# Altium footprint library Miscellaneous C_nn.PcbLib: 416 footprints (part 5 of 26)
Each footprint in its own frame and in the unit in brackets; x right, y up, seen from the top. Pads: shape width x height; smd on the part's side, far side on the other; paste and mask are expansions set on the pad; w line width, h text height; cw(c..) or ccw(c..) is an arc to the next point about the centre after c.
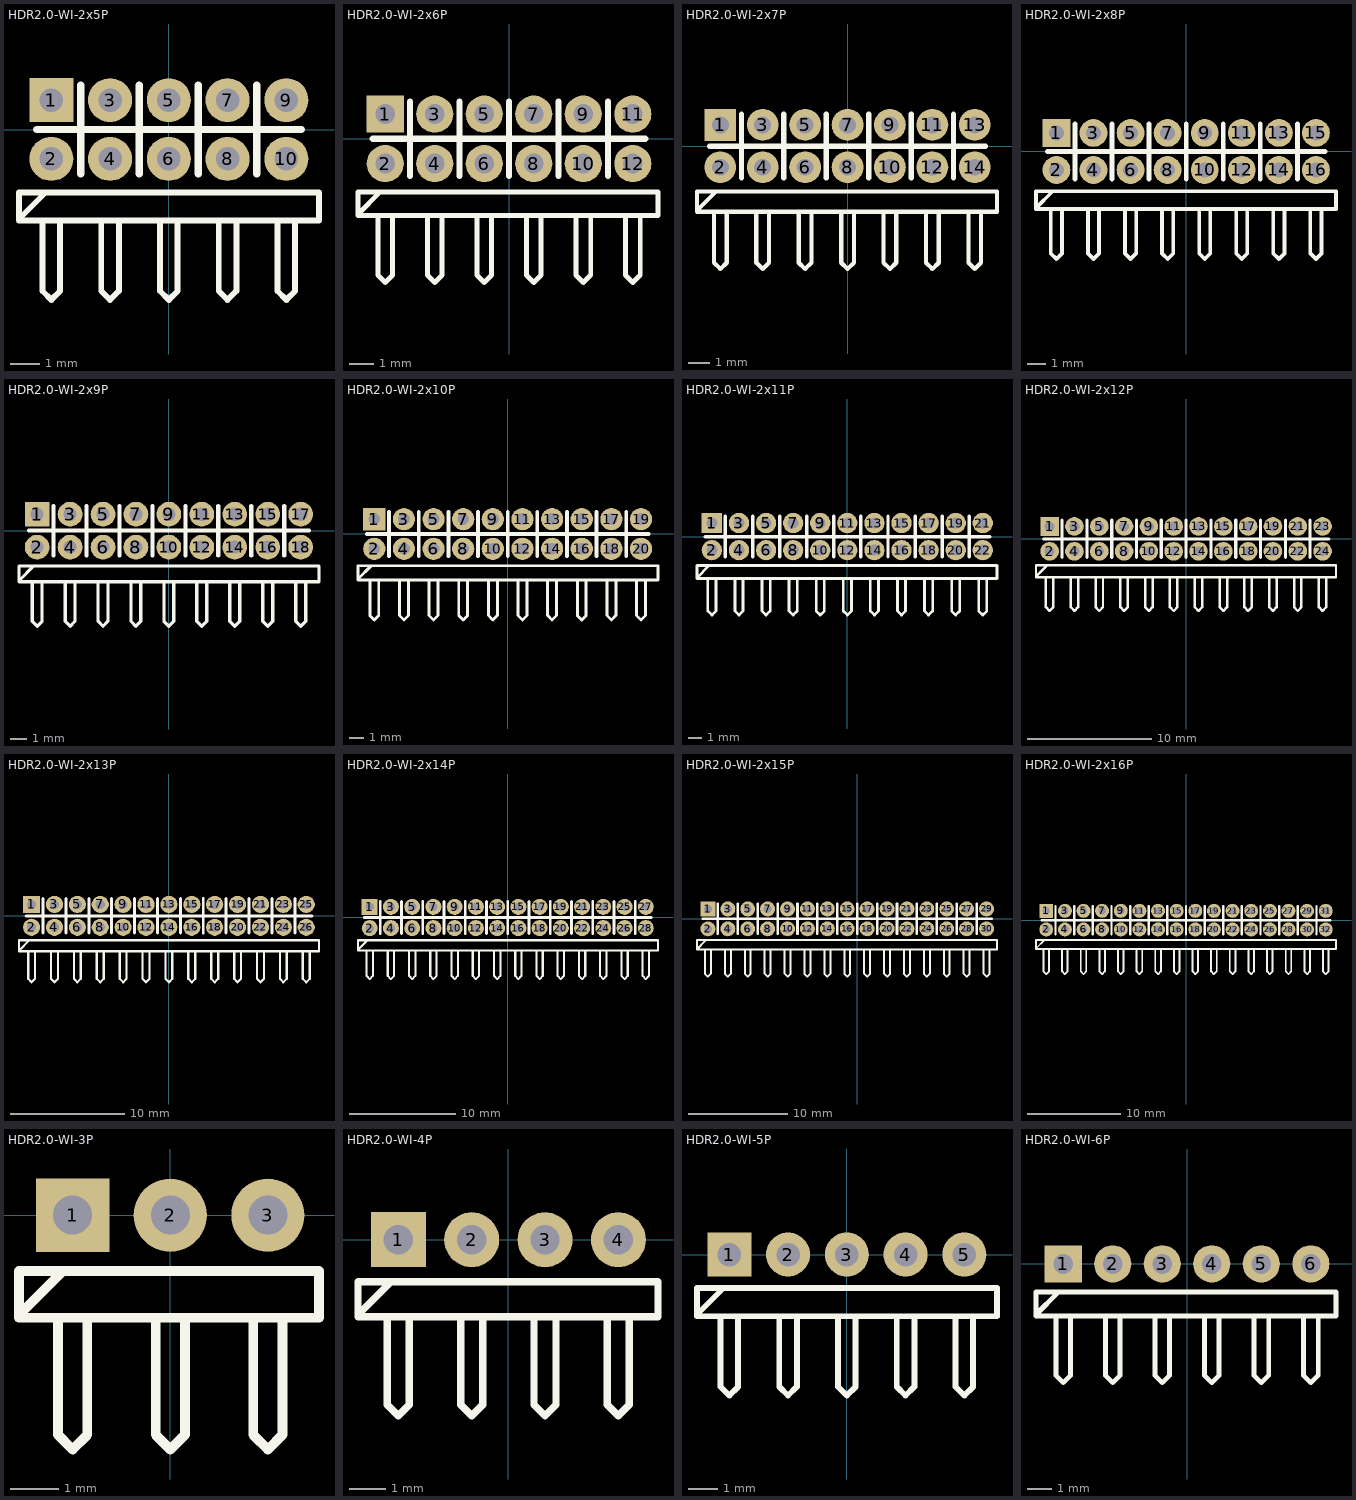
[diagram p4: the footprints below, top view; thin cyan lines are the x and y axes]

## HDR2.0-WI-2x5P [mm] "卧插，脚距：2.0mm"
pads (10):
  rect 1.5x1.5 hole 0.8: 1(-4,1)
  round 1.5 hole 0.8: 2(-4,-1) 3(-2,1) 4(-2,-1) 5(0,1) 6(0,-1) 7(2,1) 8(2,-1) 9(4,1) 10(4,-1)
Top Overlay:
  lines w0.2: -5.1,-2.8 -5.1,-2.743 ; -4.3,-3.2 -4.3,-5.5 -4,-5.8 -3.7,-5.5 -3.7,-3.1 ; -4.2,-2.143 -5.1,-3.043 -5.1,-3.1 ; -2.3,-3.2 -2.3,-5.5 -2,-5.8 -1.7,-5.5 -1.7,-3.1 ; -0.3,-3.2 -0.3,-5.5 0,-5.8 0.3,-5.5 0.3,-3.1 ; 1.7,-3.2 1.7,-5.5 2,-5.8 2.3,-5.5 2.3,-3.1 ; 3.7,-3.2 3.7,-5.5 4,-5.8 4.3,-5.5 4.3,-3.1 ; -5.1,-3.1 -5.1,-2.143 -3.492,-2.143 5.112,-2.143 5.112,-3.1 -5.1,-3.1
  lines w0.254: -4.5,0 4.5,0 ; -3,-1.5 -3,1.5 ; -1,-1.5 -1,1.5 ; 1,-1.5 1,1.5 ; 3,-1.5 3,1.5
Bottom Overlay:
  lines w0.254: -4.5,0 4.5,0 ; -3,-1.5 -3,1.5 ; -1,-1.5 -1,1.5 ; 1,-1.5 1,1.5 ; 3,-1.5 3,1.5
3D body "HDR2.0-WI-2x5P.STEP": height 5.25, standoff -2.77, extent -5,-6 5,2

## HDR2.0-WI-2x6P [mm] "卧插，脚距：2.0mm"
pads (12):
  rect 1.5x1.5 hole 0.8: 1(-5,1)
  round 1.5 hole 0.8: 2(-5,-1) 3(-3,1) 4(-3,-1) 5(-1,1) 6(-1,-1) 7(1,1) 8(1,-1) 9(3,1) 10(3,-1) 11(5,1) 12(5,-1)
Top Overlay:
  lines w0.2: -6.1,-2.8 -6.1,-2.743 ; -5.3,-3.2 -5.3,-5.5 -5,-5.8 -4.7,-5.5 -4.7,-3.1 ; -5.2,-2.143 -6.1,-3.043 -6.1,-3.1 ; -3.3,-3.2 -3.3,-5.5 -3,-5.8 -2.7,-5.5 -2.7,-3.1 ; -1.3,-3.2 -1.3,-5.5 -1,-5.8 -0.7,-5.5 -0.7,-3.1 ; 0.7,-3.2 0.7,-5.5 1,-5.8 1.3,-5.5 1.3,-3.1 ; 2.7,-3.2 2.7,-5.5 3,-5.8 3.3,-5.5 3.3,-3.1 ; 4.7,-3.2 4.7,-5.5 5,-5.8 5.3,-5.5 5.3,-3.1 ; -6.1,-3.1 6.017,-3.1 6.017,-2.143 -4.492,-2.143 -6.1,-2.143 -6.1,-3.1
  lines w0.254: -5.5,0 5.5,0 ; -4,-1.5 -4,1.5 ; -2,-1.5 -2,1.5 ; 0,-1.5 0,1.5 ; 2,-1.5 2,1.5 ; 4,-1.5 4,1.5
Bottom Overlay:
  lines w0.254: -5.5,0 5.5,0 ; -4,-1.5 -4,1.5 ; -2,-1.5 -2,1.5 ; 0,-1.5 0,1.5 ; 2,-1.5 2,1.5 ; 4,-1.5 4,1.5
3D body "HDR2.0-WI-2x6P.STEP": height 5.25, standoff -2.77, extent -6,-6 6,2

## HDR2.0-WI-2x7P [mm] "卧插，脚距：2.0mm"
pads (14):
  rect 1.5x1.5 hole 0.8: 1(-6,1)
  round 1.5 hole 0.8: 2(-6,-1) 3(-4,1) 4(-4,-1) 5(-2,1) 6(-2,-1) 7(0,1) 8(0,-1) 9(2,1) 10(2,-1) 11(4,1) 12(4,-1) 13(6,1) 14(6,-1)
Top Overlay:
  lines w0.2: -7.1,-2.8 -7.1,-2.743 ; -6.3,-3.2 -6.3,-5.5 -6,-5.8 -5.7,-5.5 -5.7,-3.1 ; -6.2,-2.143 -7.1,-3.043 -7.1,-3.1 ; -4.3,-3.2 -4.3,-5.5 -4,-5.8 -3.7,-5.5 -3.7,-3.1 ; -2.3,-3.2 -2.3,-5.5 -2,-5.8 -1.7,-5.5 -1.7,-3.1 ; -0.3,-3.2 -0.3,-5.5 0,-5.8 0.3,-5.5 0.3,-3.1 ; 1.7,-3.2 1.7,-5.5 2,-5.8 2.3,-5.5 2.3,-3.1 ; 3.7,-3.2 3.7,-5.5 4,-5.8 4.3,-5.5 4.3,-3.1 ; 5.7,-3.2 5.7,-5.5 6,-5.8 6.3,-5.5 6.3,-3.1 ; -7.1,-3.1 -7.1,-2.143 -5.492,-2.143 7.049,-2.143 7.049,-3.1 -7.1,-3.1
  lines w0.254: -6.5,0 6.5,0 ; -5,-1.5 -5,1.5 ; -3,-1.5 -3,1.5 ; -1,-1.5 -1,1.5 ; 1,-1.5 1,1.5 ; 3,-1.5 3,1.5 ; 5,-1.5 5,1.5
Bottom Overlay:
  lines w0.254: -6.5,0 6.5,0 ; -5,-1.5 -5,1.5 ; -3,-1.5 -3,1.5 ; -1,-1.5 -1,1.5 ; 1,-1.5 1,1.5 ; 3,-1.5 3,1.5 ; 5,-1.5 5,1.5
3D body "HDR2.0-WI-2x7P.STEP": height 5.25, standoff -2.77, extent -7,-6 7,2

## HDR2.0-WI-2x8P [mm] "卧插，脚距：2.0mm"
pads (16):
  rect 1.5x1.5 hole 0.8: 1(-7,1)
  round 1.5 hole 0.8: 2(-7,-1) 3(-5,1) 4(-5,-1) 5(-3,1) 6(-3,-1) 7(-1,1) 8(-1,-1) 9(1,1) 10(1,-1) 11(3,1) 12(3,-1) 13(5,1) 14(5,-1) 15(7,1) 16(7,-1)
Top Overlay:
  lines w0.2: -8.1,-2.8 -8.1,-2.743 ; -7.3,-3.2 -7.3,-5.5 -7,-5.8 -6.7,-5.5 -6.7,-3.1 ; -7.2,-2.143 -8.1,-3.043 -8.1,-3.1 ; -5.3,-3.2 -5.3,-5.5 -5,-5.8 -4.7,-5.5 -4.7,-3.1 ; -3.3,-3.2 -3.3,-5.5 -3,-5.8 -2.7,-5.5 -2.7,-3.1 ; -1.3,-3.2 -1.3,-5.5 -1,-5.8 -0.7,-5.5 -0.7,-3.1 ; 0.7,-3.2 0.7,-5.5 1,-5.8 1.3,-5.5 1.3,-3.1 ; 2.7,-3.2 2.7,-5.5 3,-5.8 3.3,-5.5 3.3,-3.1 ; 4.7,-3.2 4.7,-5.5 5,-5.8 5.3,-5.5 5.3,-3.1 ; 6.7,-3.2 6.7,-5.5 7,-5.8 7.3,-5.5 7.3,-3.1 ; -8.1,-3.1 8.081,-3.1 8.081,-2.143 -6.492,-2.143 -8.1,-2.143 -8.1,-3.1
  lines w0.254: -7.5,0 7.5,0 ; -6,-1.5 -6,1.5 ; -4,-1.5 -4,1.5 ; -2,-1.5 -2,1.5 ; 0,-1.5 0,1.5 ; 2,-1.5 2,1.5 ; 4,-1.5 4,1.5 ; 6,-1.5 6,1.5
Bottom Overlay:
  lines w0.254: -7.5,0 7.5,0 ; -6,-1.5 -6,1.5 ; -4,-1.5 -4,1.5 ; -2,-1.5 -2,1.5 ; 0,-1.5 0,1.5 ; 2,-1.5 2,1.5 ; 4,-1.5 4,1.5 ; 6,-1.5 6,1.5
3D body "HDR2.0-WI-2x8P.STEP": height 5.25, standoff -2.77, extent -8,-6 8,2

## HDR2.0-WI-2x9P [mm] "卧插，脚距：2.0mm"
pads (18):
  rect 1.5x1.5 hole 0.8: 1(-8,1)
  round 1.5 hole 0.8: 2(-8,-1) 3(-6,1) 4(-6,-1) 5(-4,1) 6(-4,-1) 7(-2,1) 8(-2,-1) 9(0,1) 10(0,-1) 11(2,1) 12(2,-1) 13(4,1) 14(4,-1) 15(6,1) 16(6,-1) 17(8,1) 18(8,-1)
Top Overlay:
  lines w0.2: -9.1,-2.8 -9.1,-2.743 ; -8.3,-3.2 -8.3,-5.5 -8,-5.8 -7.7,-5.5 -7.7,-3.1 ; -8.2,-2.143 -9.1,-3.043 -9.1,-3.1 ; -6.3,-3.2 -6.3,-5.5 -6,-5.8 -5.7,-5.5 -5.7,-3.1 ; -4.3,-3.2 -4.3,-5.5 -4,-5.8 -3.7,-5.5 -3.7,-3.1 ; -2.3,-3.2 -2.3,-5.5 -2,-5.8 -1.7,-5.5 -1.7,-3.1 ; -0.3,-3.2 -0.3,-5.5 0,-5.8 0.3,-5.5 0.3,-3.1 ; 1.7,-3.2 1.7,-5.5 2,-5.8 2.3,-5.5 2.3,-3.1 ; 3.7,-3.2 3.7,-5.5 4,-5.8 4.3,-5.5 4.3,-3.1 ; 5.7,-3.2 5.7,-5.5 6,-5.8 6.3,-5.5 6.3,-3.1 ; 7.7,-3.2 7.7,-5.5 8,-5.8 8.3,-5.5 8.3,-3.1 ; -9.1,-3.1 9.113,-3.1 9.113,-2.143 -7.492,-2.143 -9.1,-2.143 -9.1,-3.1
  lines w0.254: -8.5,0 8.5,0 ; -7,-1.5 -7,1.5 ; -5,-1.5 -5,1.5 ; -3,-1.5 -3,1.5 ; -1,-1.5 -1,1.5 ; 1,-1.5 1,1.5 ; 3,-1.5 3,1.5 ; 5,-1.5 5,1.5 ; 7,-1.5 7,1.5
Bottom Overlay:
  lines w0.254: -8.5,0 8.5,0 ; -7,-1.5 -7,1.5 ; -5,-1.5 -5,1.5 ; -3,-1.5 -3,1.5 ; -1,-1.5 -1,1.5 ; 1,-1.5 1,1.5 ; 3,-1.5 3,1.5 ; 5,-1.5 5,1.5 ; 7,-1.5 7,1.5
3D body "HDR2.0-WI-2x9P.STEP": height 5.25, standoff -2.77, extent -9,-6 9,2

## HDR2.0-WI-2x10P [mm] "卧插，脚距：2.0mm"
pads (20):
  rect 1.5x1.5 hole 0.8: 1(-9,1)
  round 1.5 hole 0.8: 2(-9,-1) 3(-7,1) 4(-7,-1) 5(-5,1) 6(-5,-1) 7(-3,1) 8(-3,-1) 9(-1,1) 10(-1,-1) 11(1,1) 12(1,-1) 13(3,1) 14(3,-1) 15(5,1) 16(5,-1) 17(7,1) 18(7,-1) 19(9,1) 20(9,-1)
Top Overlay:
  lines w0.2: -10.1,-2.8 -10.1,-2.743 ; -9.3,-3.2 -9.3,-5.5 -9,-5.8 -8.7,-5.5 -8.7,-3.1 ; -9.2,-2.143 -10.1,-3.043 -10.1,-3.1 ; -7.3,-3.2 -7.3,-5.5 -7,-5.8 -6.7,-5.5 -6.7,-3.1 ; -5.3,-3.2 -5.3,-5.5 -5,-5.8 -4.7,-5.5 -4.7,-3.1 ; -3.3,-3.2 -3.3,-5.5 -3,-5.8 -2.7,-5.5 -2.7,-3.1 ; -1.3,-3.2 -1.3,-5.5 -1,-5.8 -0.7,-5.5 -0.7,-3.1 ; 0.7,-3.2 0.7,-5.5 1,-5.8 1.3,-5.5 1.3,-3.1 ; 2.7,-3.2 2.7,-5.5 3,-5.8 3.3,-5.5 3.3,-3.1 ; 4.7,-3.2 4.7,-5.5 5,-5.8 5.3,-5.5 5.3,-3.1 ; 6.7,-3.2 6.7,-5.5 7,-5.8 7.3,-5.5 7.3,-3.1 ; 8.7,-3.2 8.7,-5.5 9,-5.8 9.3,-5.5 9.3,-3.1 ; -10.1,-3.1 -10.1,-2.143 -8.492,-2.143 10.145,-2.143 10.145,-3.1 -10.1,-3.1
  lines w0.254: -9.5,0 9.5,0 -9.5,0 ; -8,-1.5 -8,1.5 -8,-1.5 ; -6,-1.5 -6,1.5 -6,-1.5 ; -4,-1.5 -4,1.5 -4,-1.5 ; -2,-1.5 -2,1.5 -2,-1.5 ; 0,-1.5 0,1.5 0,-1.5 ; 2,-1.5 2,1.5 2,-1.5 ; 4,-1.5 4,1.5 4,-1.5 ; 6,-1.5 6,1.5 6,-1.5 ; 8,-1.5 8,1.5 8,-1.5
Bottom Overlay:
  lines w0.254: -9.5,0 9.5,0 -9.5,0 ; -8,-1.5 -8,1.5 -8,-1.5 ; -6,-1.5 -6,1.5 -6,-1.5 ; -4,-1.5 -4,1.5 -4,-1.5 ; -2,-1.5 -2,1.5 -2,-1.5 ; 0,-1.5 0,1.5 0,-1.5 ; 2,-1.5 2,1.5 2,-1.5 ; 4,-1.5 4,1.5 4,-1.5 ; 6,-1.5 6,1.5 6,-1.5 ; 8,-1.5 8,1.5 8,-1.5
3D body "HDR2.0-WI-2x10P.STEP": height 5.25, standoff -2.77, extent -10,-6 10,2

## HDR2.0-WI-2x11P [mm] "卧插，脚距：2.0mm"
pads (22):
  rect 1.5x1.5 hole 0.8: 1(-10,1)
  round 1.5 hole 0.8: 2(-10,-1) 3(-8,1) 4(-8,-1) 5(-6,1) 6(-6,-1) 7(-4,1) 8(-4,-1) 9(-2,1) 10(-2,-1) 11(0,1) 12(0,-1) 13(2,1) 14(2,-1) 15(4,1) 16(4,-1) 17(6,1) 18(6,-1) 19(8,1) 20(8,-1) 21(10,1) 22(10,-1)
Top Overlay:
  lines w0.2: -11.1,-2.8 -11.1,-2.743 ; -10.3,-3.2 -10.3,-5.5 -10,-5.8 -9.7,-5.5 -9.7,-3.1 ; -10.2,-2.143 -11.1,-3.043 -11.1,-3.1 ; -8.3,-3.2 -8.3,-5.5 -8,-5.8 -7.7,-5.5 -7.7,-3.1 ; -6.3,-3.2 -6.3,-5.5 -6,-5.8 -5.7,-5.5 -5.7,-3.1 ; -4.3,-3.2 -4.3,-5.5 -4,-5.8 -3.7,-5.5 -3.7,-3.1 ; -2.3,-3.2 -2.3,-5.5 -2,-5.8 -1.7,-5.5 -1.7,-3.1 ; -0.3,-3.2 -0.3,-5.5 0,-5.8 0.3,-5.5 0.3,-3.1 ; 1.7,-3.2 1.7,-5.5 2,-5.8 2.3,-5.5 2.3,-3.1 ; 3.7,-3.2 3.7,-5.5 4,-5.8 4.3,-5.5 4.3,-3.1 ; 5.7,-3.2 5.7,-5.5 6,-5.8 6.3,-5.5 6.3,-3.1 ; 7.7,-3.2 7.7,-5.5 8,-5.8 8.3,-5.5 8.3,-3.1 ; 9.7,-3.2 9.7,-5.5 10,-5.8 10.3,-5.5 10.3,-3.1 ; -11.1,-3.1 11.05,-3.1 11.05,-2.143 -9.492,-2.143 -11.1,-2.143 -11.1,-3.1
  lines w0.254: -10.5,0 10.5,0 ; -9,-1.5 -9,1.5 ; -7,-1.5 -7,1.5 ; -5,-1.5 -5,1.5 ; -3,-1.5 -3,1.5 ; -1,-1.5 -1,1.5 ; 1,-1.5 1,1.5 ; 3,-1.5 3,1.5 ; 5,-1.5 5,1.5 ; 7,-1.5 7,1.5 ; 9,-1.5 9,1.5
Bottom Overlay:
  lines w0.254: -10.5,0 10.5,0 ; -9,-1.5 -9,1.5 ; -7,-1.5 -7,1.5 ; -5,-1.5 -5,1.5 ; -3,-1.5 -3,1.5 ; -1,-1.5 -1,1.5 ; 1,-1.5 1,1.5 ; 3,-1.5 3,1.5 ; 5,-1.5 5,1.5 ; 7,-1.5 7,1.5 ; 9,-1.5 9,1.5
3D body "HDR2.0-WI-2x11P.STEP": height 5.25, standoff -2.77, extent -11,-6 11,2

## HDR2.0-WI-2x12P [mm] "卧插，脚距：2.0mm"
pads (24):
  rect 1.5x1.5 hole 0.8: 1(-11,1)
  round 1.5 hole 0.8: 2(-11,-1) 3(-9,1) 4(-9,-1) 5(-7,1) 6(-7,-1) 7(-5,1) 8(-5,-1) 9(-3,1) 10(-3,-1) 11(-1,1) 12(-1,-1) 13(1,1) 14(1,-1) 15(3,1) 16(3,-1) 17(5,1) 18(5,-1) 19(7,1) 20(7,-1) 21(9,1) 22(9,-1) 23(11,1) 24(11,-1)
Top Overlay:
  lines w0.2: -12.1,-2.8 -12.1,-2.743 ; -11.3,-3.2 -11.3,-5.5 -11,-5.8 -10.7,-5.5 -10.7,-3.1 ; -11.2,-2.143 -12.1,-3.043 -12.1,-3.1 ; -9.3,-3.2 -9.3,-5.5 -9,-5.8 -8.7,-5.5 -8.7,-3.1 ; -7.3,-3.2 -7.3,-5.5 -7,-5.8 -6.7,-5.5 -6.7,-3.1 ; -5.3,-3.2 -5.3,-5.5 -5,-5.8 -4.7,-5.5 -4.7,-3.1 ; -3.3,-3.2 -3.3,-5.5 -3,-5.8 -2.7,-5.5 -2.7,-3.1 ; -1.3,-3.2 -1.3,-5.5 -1,-5.8 -0.7,-5.5 -0.7,-3.1 ; 0.7,-3.2 0.7,-5.5 1,-5.8 1.3,-5.5 1.3,-3.1 ; 2.7,-3.2 2.7,-5.5 3,-5.8 3.3,-5.5 3.3,-3.1 ; 4.7,-3.2 4.7,-5.5 5,-5.8 5.3,-5.5 5.3,-3.1 ; 6.7,-3.2 6.7,-5.5 7,-5.8 7.3,-5.5 7.3,-3.1 ; 8.7,-3.2 8.7,-5.5 9,-5.8 9.3,-5.5 9.3,-3.1 ; 10.7,-3.2 10.7,-5.5 11,-5.8 11.3,-5.5 11.3,-3.1 ; -12.1,-3.1 -12.1,-2.143 -10.492,-2.143 12.082,-2.143 12.082,-3.1 -12.1,-3.1
  lines w0.254: -11.5,0 11.5,0 ; -10,-1.5 -10,1.5 ; -8,-1.5 -8,1.5 ; -6,-1.5 -6,1.5 ; -4,-1.5 -4,1.5 ; -2,-1.5 -2,1.5 ; 0,-1.5 0,1.5 ; 2,-1.5 2,1.5 ; 4,-1.5 4,1.5 ; 6,-1.5 6,1.5 ; 8,-1.5 8,1.5 ; 10,-1.5 10,1.5
Bottom Overlay:
  lines w0.254: -11.5,0 11.5,0 ; -10,-1.5 -10,1.5 ; -8,-1.5 -8,1.5 ; -6,-1.5 -6,1.5 ; -4,-1.5 -4,1.5 ; -2,-1.5 -2,1.5 ; 0,-1.5 0,1.5 ; 2,-1.5 2,1.5 ; 4,-1.5 4,1.5 ; 6,-1.5 6,1.5 ; 8,-1.5 8,1.5 ; 10,-1.5 10,1.5
3D body "HDR2.0-WI-2x12P.STEP": height 5.25, standoff -2.77, extent -12,-6 12,2

## HDR2.0-WI-2x13P [mm] "卧插，脚距：2.0mm"
pads (26):
  rect 1.5x1.5 hole 0.8: 1(-12,1)
  round 1.5 hole 0.8: 2(-12,-1) 3(-10,1) 4(-10,-1) 5(-8,1) 6(-8,-1) 7(-6,1) 8(-6,-1) 9(-4,1) 10(-4,-1) 11(-2,1) 12(-2,-1) 13(0,1) 14(0,-1) 15(2,1) 16(2,-1) 17(4,1) 18(4,-1) 19(6,1) 20(6,-1) 21(8,1) 22(8,-1) 23(10,1) 24(10,-1) 25(12,1) 26(12,-1)
Top Overlay:
  lines w0.2: -13.1,-2.8 -13.1,-2.743 ; -12.3,-3.2 -12.3,-5.5 -12,-5.8 -11.7,-5.5 -11.7,-3.1 ; -12.2,-2.143 -13.1,-3.043 -13.1,-3.1 ; -10.3,-3.2 -10.3,-5.5 -10,-5.8 -9.7,-5.5 -9.7,-3.1 ; -8.3,-3.2 -8.3,-5.5 -8,-5.8 -7.7,-5.5 -7.7,-3.1 ; -6.3,-3.2 -6.3,-5.5 -6,-5.8 -5.7,-5.5 -5.7,-3.1 ; -4.3,-3.2 -4.3,-5.5 -4,-5.8 -3.7,-5.5 -3.7,-3.1 ; -2.3,-3.2 -2.3,-5.5 -2,-5.8 -1.7,-5.5 -1.7,-3.1 ; -0.3,-3.2 -0.3,-5.5 0,-5.8 0.3,-5.5 0.3,-3.1 ; 1.7,-3.2 1.7,-5.5 2,-5.8 2.3,-5.5 2.3,-3.1 ; 3.7,-3.2 3.7,-5.5 4,-5.8 4.3,-5.5 4.3,-3.1 ; 5.7,-3.2 5.7,-5.5 6,-5.8 6.3,-5.5 6.3,-3.1 ; 7.7,-3.2 7.7,-5.5 8,-5.8 8.3,-5.5 8.3,-3.1 ; 9.7,-3.2 9.7,-5.5 10,-5.8 10.3,-5.5 10.3,-3.1 ; 11.7,-3.2 11.7,-5.5 12,-5.8 12.3,-5.5 12.3,-3.1 ; -13.1,-3.1 13.114,-3.1 13.114,-2.143 -11.492,-2.143 -13.1,-2.143 -13.1,-3.1
  lines w0.254: -12.5,0 12.5,0 ; -11,-1.5 -11,1.5 ; -9,-1.5 -9,1.5 ; -7,-1.5 -7,1.5 ; -5,-1.5 -5,1.5 ; -3,-1.5 -3,1.5 ; -1,-1.5 -1,1.5 ; 1,-1.5 1,1.5 ; 3,-1.5 3,1.5 ; 5,-1.5 5,1.5 ; 7,-1.5 7,1.5 ; 9,-1.5 9,1.5 ; 11,-1.5 11,1.5
Bottom Overlay:
  lines w0.254: -12.5,0 12.5,0 ; -11,-1.5 -11,1.5 ; -9,-1.5 -9,1.5 ; -7,-1.5 -7,1.5 ; -5,-1.5 -5,1.5 ; -3,-1.5 -3,1.5 ; -1,-1.5 -1,1.5 ; 1,-1.5 1,1.5 ; 3,-1.5 3,1.5 ; 5,-1.5 5,1.5 ; 7,-1.5 7,1.5 ; 9,-1.5 9,1.5 ; 11,-1.5 11,1.5
3D body "HDR2.0-WI-2x13P.STEP": height 5.25, standoff -2.77, extent -13,-6 13,2

## HDR2.0-WI-2x14P [mm] "卧插，脚距：2.0mm"
pads (28):
  rect 1.5x1.5 hole 0.8: 1(-13,1)
  round 1.5 hole 0.8: 2(-13,-1) 3(-11,1) 4(-11,-1) 5(-9,1) 6(-9,-1) 7(-7,1) 8(-7,-1) 9(-5,1) 10(-5,-1) 11(-3,1) 12(-3,-1) 13(-1,1) 14(-1,-1) 15(1,1) 16(1,-1) 17(3,1) 18(3,-1) 19(5,1) 20(5,-1) 21(7,1) 22(7,-1) 23(9,1) 24(9,-1) 25(11,1) 26(11,-1) 27(13,1) 28(13,-1)
Top Overlay:
  lines w0.2: -14.1,-2.8 -14.1,-2.743 ; -13.3,-3.2 -13.3,-5.5 -13,-5.8 -12.7,-5.5 -12.7,-3.1 ; -13.2,-2.143 -14.1,-3.043 -14.1,-3.1 ; -11.3,-3.2 -11.3,-5.5 -11,-5.8 -10.7,-5.5 -10.7,-3.1 ; -9.3,-3.2 -9.3,-5.5 -9,-5.8 -8.7,-5.5 -8.7,-3.1 ; -7.3,-3.2 -7.3,-5.5 -7,-5.8 -6.7,-5.5 -6.7,-3.1 ; -5.3,-3.2 -5.3,-5.5 -5,-5.8 -4.7,-5.5 -4.7,-3.1 ; -3.3,-3.2 -3.3,-5.5 -3,-5.8 -2.7,-5.5 -2.7,-3.1 ; -1.3,-3.2 -1.3,-5.5 -1,-5.8 -0.7,-5.5 -0.7,-3.1 ; 0.7,-3.2 0.7,-5.5 1,-5.8 1.3,-5.5 1.3,-3.1 ; 2.7,-3.2 2.7,-5.5 3,-5.8 3.3,-5.5 3.3,-3.1 ; 4.7,-3.2 4.7,-5.5 5,-5.8 5.3,-5.5 5.3,-3.1 ; 6.7,-3.2 6.7,-5.5 7,-5.8 7.3,-5.5 7.3,-3.1 ; 8.7,-3.2 8.7,-5.5 9,-5.8 9.3,-5.5 9.3,-3.1 ; 10.7,-3.2 10.7,-5.5 11,-5.8 11.3,-5.5 11.3,-3.1 ; 12.7,-3.2 12.7,-5.5 13,-5.8 13.3,-5.5 13.3,-3.1 ; -14.1,-3.1 -14.1,-2.143 -12.492,-2.143 14.146,-2.143 14.146,-3.1 -14.1,-3.1
  lines w0.254: -13.5,0 13.5,0 ; -12,-1.5 -12,1.5 ; -10,-1.5 -10,1.5 ; -8,-1.5 -8,1.5 ; -6,-1.5 -6,1.5 ; -4,-1.5 -4,1.5 ; -2,-1.5 -2,1.5 ; 0,-1.5 0,1.5 ; 2,-1.5 2,1.5 ; 4,-1.5 4,1.5 ; 6,-1.5 6,1.5 ; 8,-1.5 8,1.5 ; 10,-1.5 10,1.5 ; 12,-1.5 12,1.5
Bottom Overlay:
  lines w0.254: -13.5,0 13.5,0 ; -12,-1.5 -12,1.5 ; -10,-1.5 -10,1.5 ; -8,-1.5 -8,1.5 ; -6,-1.5 -6,1.5 ; -4,-1.5 -4,1.5 ; -2,-1.5 -2,1.5 ; 0,-1.5 0,1.5 ; 2,-1.5 2,1.5 ; 4,-1.5 4,1.5 ; 6,-1.5 6,1.5 ; 8,-1.5 8,1.5 ; 10,-1.5 10,1.5 ; 12,-1.5 12,1.5
3D body "HDR2.0-WI-2x14P.STEP": height 5.25, standoff -2.77, extent -14,-6 14,2

## HDR2.0-WI-2x15P [mm] "卧插，脚距：2.0mm"
pads (30):
  rect 1.5x1.5 hole 0.8: 1(-15,1)
  round 1.5 hole 0.8: 2(-15,-1) 3(-13,1) 4(-13,-1) 5(-11,1) 6(-11,-1) 7(-9,1) 8(-9,-1) 9(-7,1) 10(-7,-1) 11(-5,1) 12(-5,-1) 13(-3,1) 14(-3,-1) 15(-1,1) 16(-1,-1) 17(1,1) 18(1,-1) 19(3,1) 20(3,-1) 21(5,1) 22(5,-1) 23(7,1) 24(7,-1) 25(9,1) 26(9,-1) 27(11,1) 28(11,-1) 29(13,1) 30(13,-1)
Top Overlay:
  lines w0.2: -16.1,-2.8 -16.1,-2.743 ; -15.3,-3.2 -15.3,-5.5 -15,-5.8 -14.7,-5.5 -14.7,-3.1 ; -15.2,-2.143 -16.1,-3.043 -16.1,-3.1 ; -13.3,-3.2 -13.3,-5.5 -13,-5.8 -12.7,-5.5 -12.7,-3.1 ; -11.3,-3.2 -11.3,-5.5 -11,-5.8 -10.7,-5.5 -10.7,-3.1 ; -9.3,-3.2 -9.3,-5.5 -9,-5.8 -8.7,-5.5 -8.7,-3.1 ; -7.3,-3.2 -7.3,-5.5 -7,-5.8 -6.7,-5.5 -6.7,-3.1 ; -5.3,-3.2 -5.3,-5.5 -5,-5.8 -4.7,-5.5 -4.7,-3.1 ; -3.3,-3.2 -3.3,-5.5 -3,-5.8 -2.7,-5.5 -2.7,-3.1 ; -1.3,-3.2 -1.3,-5.5 -1,-5.8 -0.7,-5.5 -0.7,-3.1 ; 0.7,-3.2 0.7,-5.5 1,-5.8 1.3,-5.5 1.3,-3.1 ; 2.7,-3.2 2.7,-5.5 3,-5.8 3.3,-5.5 3.3,-3.1 ; 4.7,-3.2 4.7,-5.5 5,-5.8 5.3,-5.5 5.3,-3.1 ; 6.7,-3.2 6.7,-5.5 7,-5.8 7.3,-5.5 7.3,-3.1 ; 8.7,-3.2 8.7,-5.5 9,-5.8 9.3,-5.5 9.3,-3.1 ; 10.7,-3.2 10.7,-5.5 11,-5.8 11.3,-5.5 11.3,-3.1 ; 12.7,-3.2 12.7,-5.5 13,-5.8 13.3,-5.5 13.3,-3.1 ; -16.1,-3.1 14.051,-3.1 14.051,-2.143 -14.492,-2.143 -16.1,-2.143 -16.1,-3.1
  lines w0.254: -15.5,0 13.5,0 ; -14,-1.5 -14,1.5 ; -12,-1.5 -12,1.5 ; -10,-1.5 -10,1.5 ; -8,-1.5 -8,1.5 ; -6,-1.5 -6,1.5 ; -4,-1.5 -4,1.5 ; -2,-1.5 -2,1.5 ; 0,-1.5 0,1.5 ; 2,-1.5 2,1.5 ; 4,-1.5 4,1.5 ; 6,-1.5 6,1.5 ; 8,-1.5 8,1.5 ; 10,-1.5 10,1.5 ; 12,-1.5 12,1.5
Bottom Overlay:
  lines w0.254: -15.5,0 13.5,0 ; -14,-1.5 -14,1.5 ; -12,-1.5 -12,1.5 ; -10,-1.5 -10,1.5 ; -8,-1.5 -8,1.5 ; -6,-1.5 -6,1.5 ; -4,-1.5 -4,1.5 ; -2,-1.5 -2,1.5 ; 0,-1.5 0,1.5 ; 2,-1.5 2,1.5 ; 4,-1.5 4,1.5 ; 6,-1.5 6,1.5 ; 8,-1.5 8,1.5 ; 10,-1.5 10,1.5 ; 12,-1.5 12,1.5
3D body "HDR2.0-WI-2x15P.STEP": height 5.25, standoff -2.77, extent -16,-6 14,2

## HDR2.0-WI-2x16P [mm] "卧插，脚距：2.0mm"
pads (32):
  rect 1.5x1.5 hole 0.8: 1(-15,1)
  round 1.5 hole 0.8: 2(-15,-1) 3(-13,1) 4(-13,-1) 5(-11,1) 6(-11,-1) 7(-9,1) 8(-9,-1) 9(-7,1) 10(-7,-1) 11(-5,1) 12(-5,-1) 13(-3,1) 14(-3,-1) 15(-1,1) 16(-1,-1) 17(1,1) 18(1,-1) 19(3,1) 20(3,-1) 21(5,1) 22(5,-1) 23(7,1) 24(7,-1) 25(9,1) 26(9,-1) 27(11,1) 28(11,-1) 29(13,1) 30(13,-1) 31(15,1) 32(15,-1)
Top Overlay:
  lines w0.2: -16.1,-2.8 -16.1,-2.743 ; -15.3,-3.2 -15.3,-5.5 -15,-5.8 -14.7,-5.5 -14.7,-3.1 ; -15.2,-2.143 -16.1,-3.043 -16.1,-3.1 ; -13.3,-3.2 -13.3,-5.5 -13,-5.8 -12.7,-5.5 -12.7,-3.1 ; -11.3,-3.2 -11.3,-5.5 -11,-5.8 -10.7,-5.5 -10.7,-3.1 ; -9.3,-3.2 -9.3,-5.5 -9,-5.8 -8.7,-5.5 -8.7,-3.1 ; -7.3,-3.2 -7.3,-5.5 -7,-5.8 -6.7,-5.5 -6.7,-3.1 ; -5.3,-3.2 -5.3,-5.5 -5,-5.8 -4.7,-5.5 -4.7,-3.1 ; -3.3,-3.2 -3.3,-5.5 -3,-5.8 -2.7,-5.5 -2.7,-3.1 ; -1.3,-3.2 -1.3,-5.5 -1,-5.8 -0.7,-5.5 -0.7,-3.1 ; 0.7,-3.2 0.7,-5.5 1,-5.8 1.3,-5.5 1.3,-3.1 ; 2.7,-3.2 2.7,-5.5 3,-5.8 3.3,-5.5 3.3,-3.1 ; 4.7,-3.2 4.7,-5.5 5,-5.8 5.3,-5.5 5.3,-3.1 ; 6.7,-3.2 6.7,-5.5 7,-5.8 7.3,-5.5 7.3,-3.1 ; 8.7,-3.2 8.7,-5.5 9,-5.8 9.3,-5.5 9.3,-3.1 ; 10.7,-3.2 10.7,-5.5 11,-5.8 11.3,-5.5 11.3,-3.1 ; 12.7,-3.2 12.7,-5.5 13,-5.8 13.3,-5.5 13.3,-3.1 ; 14.7,-3.2 14.7,-5.5 15,-5.8 15.3,-5.5 15.3,-3.1 ; -16.1,-3.1 16.1,-3.1 16.1,-2.143 -14.492,-2.143 -16.1,-2.143 -16.1,-3.1
  lines w0.254: -15.5,0 15.5,0 ; -14,-1.5 -14,1.5 ; -12,-1.5 -12,1.5 ; -10,-1.5 -10,1.5 ; -8,-1.5 -8,1.5 ; -6,-1.5 -6,1.5 ; -4,-1.5 -4,1.5 ; -2,-1.5 -2,1.5 ; 0,-1.5 0,1.5 ; 2,-1.5 2,1.5 ; 4,-1.5 4,1.5 ; 6,-1.5 6,1.5 ; 8,-1.5 8,1.5 ; 10,-1.5 10,1.5 ; 12,-1.5 12,1.5 ; 14,-1.5 14,1.5
Bottom Overlay:
  lines w0.254: -15.5,0 15.5,0 ; -14,-1.5 -14,1.5 ; -12,-1.5 -12,1.5 ; -10,-1.5 -10,1.5 ; -8,-1.5 -8,1.5 ; -6,-1.5 -6,1.5 ; -4,-1.5 -4,1.5 ; -2,-1.5 -2,1.5 ; 0,-1.5 0,1.5 ; 2,-1.5 2,1.5 ; 4,-1.5 4,1.5 ; 6,-1.5 6,1.5 ; 8,-1.5 8,1.5 ; 10,-1.5 10,1.5 ; 12,-1.5 12,1.5 ; 14,-1.5 14,1.5
3D body "HDR2.0-WI-2x16P.STEP": height 5.25, standoff -2.77, extent -16,-6 16,2

## HDR2.0-WI-3P [mm] "卧插，脚距：2.0mm"
pads (3):
  rect 1.5x1.5 hole 0.8: 1(-2,0)
  round 1.5 hole 0.8: 2(0,0) 3(2,0)
Top Overlay:
  lines w0.2: -3.1,-1.8 -3.1,-1.743 ; -2.3,-2.2 -2.3,-4.5 -2,-4.8 -1.7,-4.5 -1.7,-2.1 ; -2.2,-1.143 -3.1,-2.043 -3.1,-2.1 ; -0.3,-2.2 -0.3,-4.5 0,-4.8 0.3,-4.5 0.3,-2.1 ; 1.7,-2.2 1.7,-4.5 2,-4.8 2.3,-4.5 2.3,-2.1 ; -3.1,-2.1 -3.1,-1.143 -1.492,-1.143 3.048,-1.143 3.048,-2.1 -3.1,-2.1
3D body "HDR2.0-WI-3P.STEP": height 3.25, standoff -2.8, extent -3,-5 3,1

## HDR2.0-WI-4P [mm] "卧插，脚距：2.0mm"
pads (4):
  rect 1.5x1.5 hole 0.8: 1(-3,0)
  round 1.5 hole 0.8: 2(-1,0) 3(1,0) 4(3,0)
Top Overlay:
  lines w0.2: -4.1,-1.8 -4.1,-1.743 ; -3.3,-2.2 -3.3,-4.5 -3,-4.8 -2.7,-4.5 -2.7,-2.1 ; -3.2,-1.143 -4.1,-2.043 -4.1,-2.1 ; -1.3,-2.2 -1.3,-4.5 -1,-4.8 -0.7,-4.5 -0.7,-2.1 ; 0.7,-2.2 0.7,-4.5 1,-4.8 1.3,-4.5 1.3,-2.1 ; 2.7,-2.2 2.7,-4.5 3,-4.8 3.3,-4.5 3.3,-2.1 ; -4.1,-2.1 4.08,-2.1 4.08,-1.143 -2.492,-1.143 -4.1,-1.143 -4.1,-2.1
3D body "HDR2.0-WI-4P.STEP": height 3.25, standoff -2.8, extent -4,-5 4,1

## HDR2.0-WI-5P [mm] "卧插，脚距：2.0mm"
pads (5):
  rect 1.5x1.5 hole 0.8: 1(-4,0)
  round 1.5 hole 0.8: 2(-2,0) 3(0,0) 4(2,0) 5(4,0)
Top Overlay:
  lines w0.2: -5.1,-1.8 -5.1,-1.743 ; -4.3,-2.2 -4.3,-4.5 -4,-4.8 -3.7,-4.5 -3.7,-2.1 ; -4.2,-1.143 -5.1,-2.043 -5.1,-2.1 ; -2.3,-2.2 -2.3,-4.5 -2,-4.8 -1.7,-4.5 -1.7,-2.1 ; -0.3,-2.2 -0.3,-4.5 0,-4.8 0.3,-4.5 0.3,-2.1 ; 1.7,-2.2 1.7,-4.5 2,-4.8 2.3,-4.5 2.3,-2.1 ; 3.7,-2.2 3.7,-4.5 4,-4.8 4.3,-4.5 4.3,-2.1 ; -5.1,-2.1 5.112,-2.1 5.112,-1.143 -3.492,-1.143 -5.1,-1.143 -5.1,-2.1
3D body "HDR2.0-WI-5P.STEP": height 3.25, standoff -2.8, extent -5,-5 5,1

## HDR2.0-WI-6P [mm] "卧插，脚距：2.0mm"
pads (6):
  rect 1.5x1.5 hole 0.8: 1(-5,0)
  round 1.5 hole 0.8: 2(-3,0) 3(-1,0) 4(1,0) 5(3,0) 6(5,0)
Top Overlay:
  lines w0.2: -6.1,-1.8 -6.1,-1.743 ; -5.3,-2.2 -5.3,-4.5 -5,-4.8 -4.7,-4.5 -4.7,-2.1 ; -5.2,-1.143 -6.1,-2.043 -6.1,-2.1 ; -3.3,-2.2 -3.3,-4.5 -3,-4.8 -2.7,-4.5 -2.7,-2.1 ; -1.3,-2.2 -1.3,-4.5 -1,-4.8 -0.7,-4.5 -0.7,-2.1 ; 0.7,-2.2 0.7,-4.5 1,-4.8 1.3,-4.5 1.3,-2.1 ; 2.7,-2.2 2.7,-4.5 3,-4.8 3.3,-4.5 3.3,-2.1 ; 4.7,-2.2 4.7,-4.5 5,-4.8 5.3,-4.5 5.3,-2.1 ; -6.1,-2.1 6.017,-2.1 6.017,-1.143 -4.492,-1.143 -6.1,-1.143 -6.1,-2.1
3D body "HDR2.0-WI-6P.STEP": height 3.25, standoff -2.8, extent -6,-5 6,1